# Altium integrated library myCPU Components.IntLib: 48 symbols
Pins are listed as number, name and electrical type; pins without a type are passive.

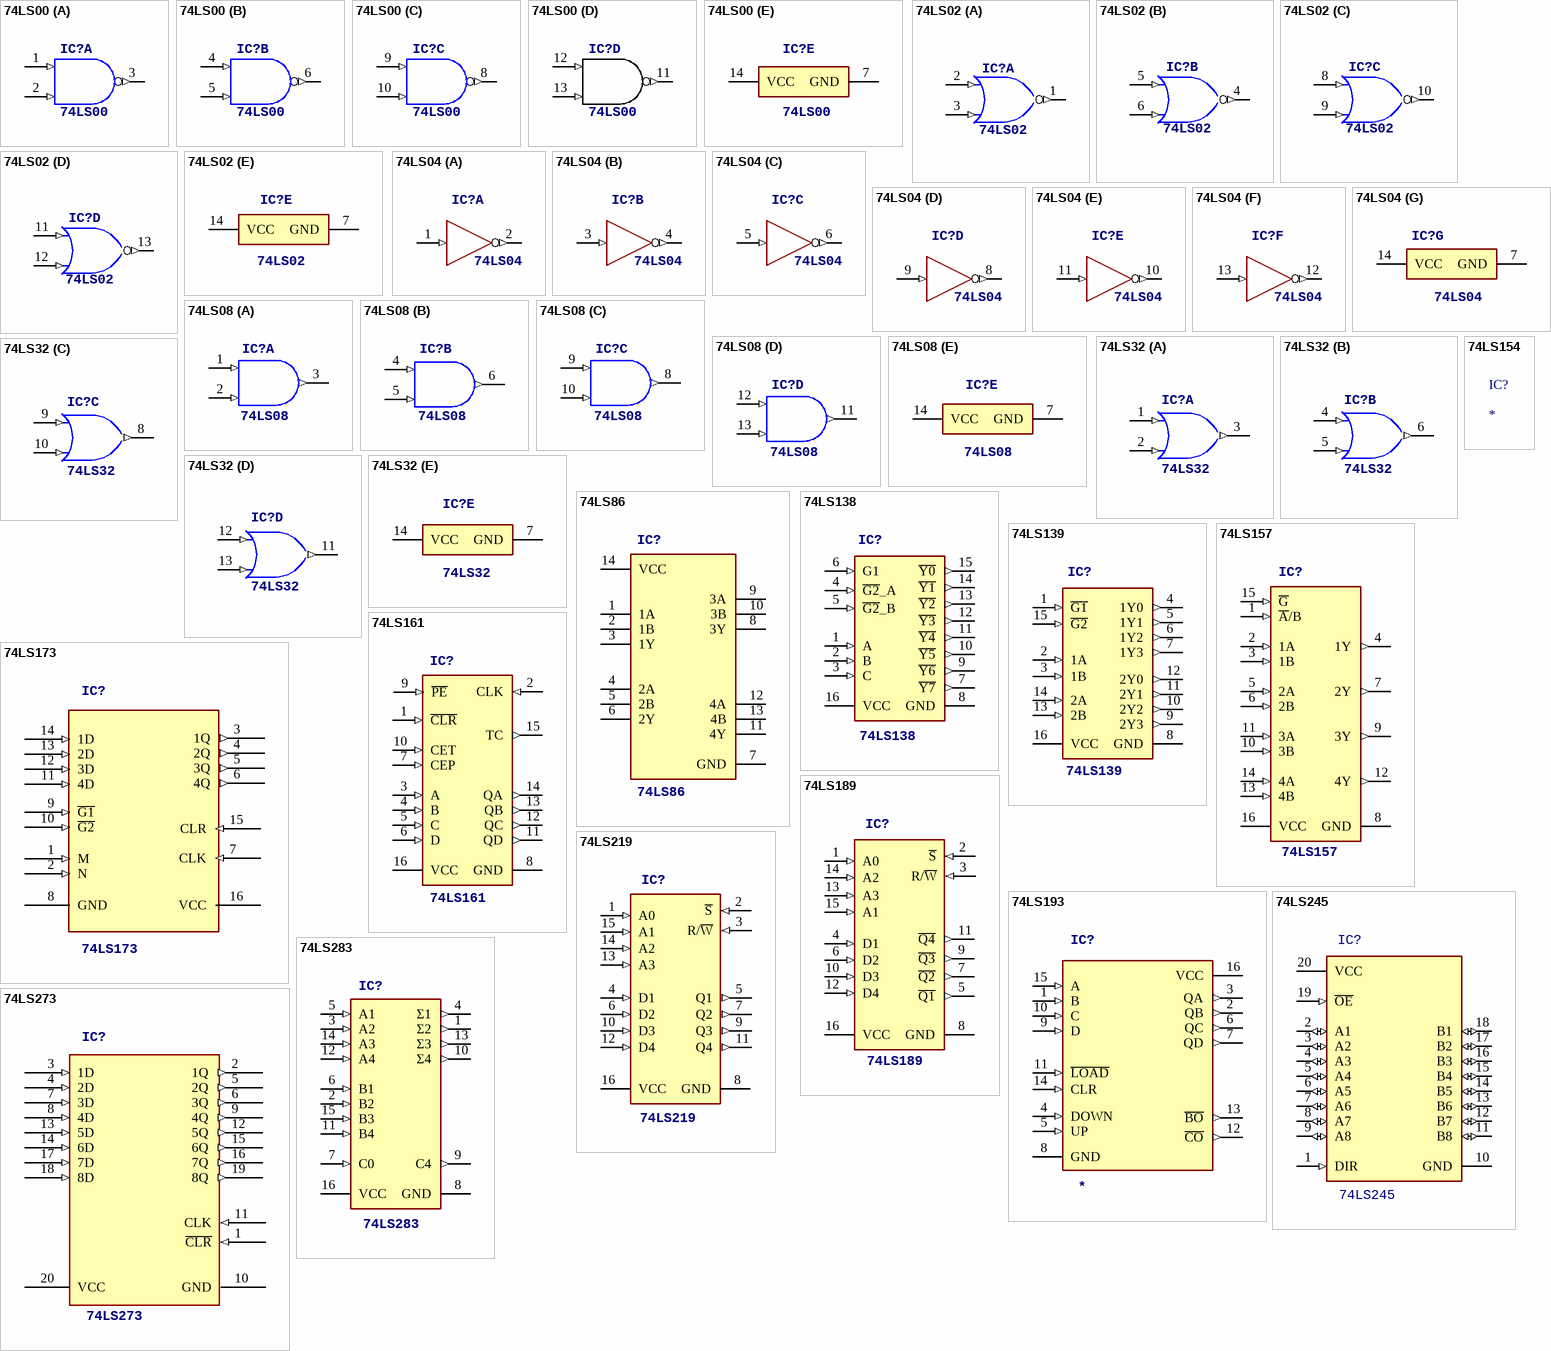
[diagram p0: symbols 74LS00 to 74LS283]

## 74LS00
designator IC?
Quad 2-input NAND gates; Value: 74LS00
footprint Generic_DIP14
part A pins: 1 1A (in) "Gate 1 input", 2 1B (in) "Gate 1 input", 3 1Y (out) "Gate 1 output"
part B pins: 4 2A (in) "Gate 2 input", 5 2B (in) "Gate 2 input", 6 2Y (out) "Gate 2 output"
part C pins: 8 3Y (out) "Gate 3 output", 9 3A (in) "Gate 3 input", 10 3B (in) "Gate 3 input"
part D pins: 11 4Y (out) "Gate 4 output", 12 4A (in) "Gate 4 input", 13 4B (in) "Gate 4 input"
part E pins: 7 GND (power) "Ground Pin", 14 VCC (power) "Power Pin"

## 74LS02
designator IC?
Quad 2-input NOR gates; Value: 74LS02
footprint Generic_DIP14
part A pins: 1 1Y (out) "1Y output", 2 1A (in) "1A input", 3 1B (in) "1B input"
part B pins: 4 2Y (out) "2Y output", 5 2A (in) "2A input", 6 2B (in) "2B input"
part C pins: 8 3A (in) "3A input", 9 3B (in) "3B input", 10 3Y (out) "3Y output"
part D pins: 11 4A (in) "4A input", 12 4B (in) "4B input", 13 4Y (out) "4Y output"
part E pins: 7 GND (power), 14 VCC (power)

## 74LS04
designator IC?
Hex inverters; Value: 74LS04
footprint Generic_DIP14
part A pins: 1 1A (in) "Input 1A", 2 ~{1Y} (out) "Output 1Y"
part B pins: 3 2A (in) "Input 2A", 4 ~{2Y} (out) "Output 2Y"
part C pins: 5 3A (in) "Input 3A", 6 ~{3Y} (out) "Output 3Y"
part D pins: 8 ~{4Y} (out) "Output 4Y", 9 4A (in) "Input 4A"
part E pins: 10 ~{5Y} (out) "Output 5Y", 11 5A (in) "Input 5A"
part F pins: 12 ~{6Y} (out) "Output 6Y", 13 6A (in) "Input 6A"
part G pins: 7 GND (power) "Ground Pin", 14 VCC (power) "Power Pin"

## 74LS08
designator IC?
Quad 2-input AND gates; Value: 74LS08
footprint Generic_DIP14
part A pins: 1 1A (in), 2 1B (in), 3 1Y (out)
part B pins: 4 2A (in), 5 2B (in), 6 2Y (out)
part C pins: 8 3Y (out), 9 3A (in), 10 3B (in)
part D pins: 11 4Y (out), 12 4A (in), 13 4B (in)
part E pins: 7 GND (power), 14 VCC (power)

## 74LS32
designator IC?
Quad 2-input OR gates.; Value: 74LS32
footprint Generic_DIP14
part A pins: 1 1A (in), 2 1B (in), 3 1Y (out)
part B pins: 4 2A (in), 5 2B (in), 6 2Y (out)
part C pins: 8 3Y (out), 9 3A (in), 10 3B (in)
part D pins: 11 4Y (out), 12 4A (in), 13 4B (in)
part E pins: 7 GND (power), 14 VCC (power)

## 74LS86
designator IC?
Quad 2-input XOR gates; Value: 74LS86
footprint Generic_DIP14
pins: 1 1A, 2 1B, 3 1Y, 4 2A, 5 2B, 6 2Y, 7 GND, 8 3Y, 9 3A, 10 3B, 11 4Y, 12 4A, 13 4B, 14 VCC

## 74LS138
designator IC?
3-Line to 8-Line decoder/demultiplexer; Value: 74LS138
footprint Generic_DIP16
pins: 1 A (in), 2 B (in), 3 C (in), 4 ~{G2}_A (in), 5 ~{G2}_B (in), 6 G1 (in), 7 ~{Y7} (out), 8 GND (power), 9 ~{Y6} (out), 10 ~{Y5} (out), 11 ~{Y4} (out), 12 ~{Y3} (out), 13 ~{Y2} (out), 14 ~{Y1} (out), 15 ~{Y0} (out), 16 VCC (power)

## 74LS139
designator IC?
Dual 2-to-4 Decoder/Demultiplexer; Value: 74LS139
footprint Generic_DIP16
pins: 1 ~{G1} (in), 2 1A (in), 3 1B (in), 4 1Y0 (out), 5 1Y1 (out), 6 1Y2 (out), 7 1Y3 (out), 8 GND (power), 9 2Y3 (out), 10 2Y2 (out), 11 2Y1 (out), 12 2Y0 (out), 13 2B (in), 14 2A (in), 15 ~{G2} (in), 16 VCC (power)

## 74LS154
designator IC?
Value: 74LS154

## 74LS157
designator IC?
4-Bits 2-Line to 1 Line data selector; Value: 74LS157
footprint Generic_DIP16 (DIP, 16-Leads, Body 19.7x6.6mm, Pitch 2.54mm)
pins: 1 ~{A}/B (in), 2 1A (in), 3 1B (in), 4 1Y (out), 5 2A (in), 6 2B (in), 7 2Y (out), 8 GND (power), 9 3Y (out), 10 3B (in), 11 3A (in), 12 4Y (out), 13 4B (in), 14 4A (in), 15 ~{G} (in), 16 VCC (power)

## 74LS161
designator IC?
4-Bit sync counter; Value: 74LS161
footprint Generic_DIP16 (DIP, 16-Leads, Body 19.7x6.6mm, Pitch 2.54mm)
pins: 1 ~{CLR} (in), 2 CLK (in), 3 A (in), 4 B (in), 5 C (in), 6 D (in), 7 CEP (in), 8 GND (power), 9 ~{PE} (in), 10 CET (in), 11 QD (out), 12 QC (out), 13 QB (out), 14 QA (out), 15 TC (out), 16 VCC (power)

## 74LS173
designator IC?
4-bit D-Type Register with 3 state outputs; Value: 74LS173
footprint Generic_DIP16 (DIP, 16-Leads, Body 19.7x6.6mm, Pitch 2.54mm)
pins: 1 M (in), 2 N (in), 3 1Q (out), 4 2Q (out), 5 3Q (out), 6 4Q (out), 7 CLK (in), 8 GND (power), 9 ~{G1} (in), 10 ~{G2} (in), 11 4D (in), 12 3D (in), 13 2D (in), 14 1D (in), 15 CLR (in), 16 VCC (power)

## 74LS189
designator IC?
SRAM 16x1 inverted outputs; Value: 74LS189
footprint Generic_DIP16 (DIP, 16-Leads, Body 19.7x6.6mm, Pitch 2.54mm)
pins: 1 A0 (in), 2 ~{S} (in), 3 R/~{W} (in), 4 D1 (in), 5 ~{Q1} (out), 6 D2 (in), 7 ~{Q2} (out), 8 GND (power), 9 ~{Q3} (out), 10 D3 (in), 11 ~{Q4} (out), 12 D4 (in), 13 A3 (in), 14 A2 (in), 15 A1 (in), 16 VCC (power)

## 74LS193
designator IC?
Value: 74LS193
footprint Generic_DIP16
pins: 1 B (in), 2 QB (out), 3 QA (out), 4 DOWN (in), 5 UP (in), 6 QC (out), 7 QD (out), 8 GND (power), 9 D (in), 10 C (in), 11 ~{LOAD} (in), 12 ~{CO} (out), 13 ~{BO} (out), 14 CLR (in), 15 A (in), 16 VCC (power)

## 74LS219
designator IC?
SRAM 16x1 non inverted outputs; Value: 74LS219
footprint Generic_DIP16 (DIP, 16-Leads, Body 19.7x6.6mm, Pitch 2.54mm)
pins: 1 A0 (in), 2 ~{S} (in), 3 R/~{W} (in), 4 D1 (in), 5 Q1 (out), 6 D2 (in), 7 Q2 (out), 8 GND (power), 9 Q3 (out), 10 D3 (in), 11 Q4 (out), 12 D4 (in), 13 A3 (in), 14 A2 (in), 15 A1 (in), 16 VCC (power)

## 74LS245
designator IC?
Non inverting bus transceiver; Value: 74LS245
footprint Generic_DIP20
pins: 1 DIR (in), 2 A1 (io), 3 A2 (io), 4 A3 (io), 5 A4 (io), 6 A5 (io), 7 A6 (io), 8 A7 (io), 9 A8 (io), 10 GND (power), 11 B8 (io), 12 B7 (io), 13 B6 (io), 14 B5 (io), 15 B4 (io), 16 B3 (io), 17 B2 (io), 18 B1 (io), 19 ~{OE} (in), 20 VCC (power)

## 74LS273
designator IC?
8-bit D-Type Register with 3 state outputs; Value: 74LS273
footprint Generic_DIP20
pins: 1 ~{CLR} (in), 2 1Q (out), 3 1D (in), 4 2D (in), 5 2Q (out), 6 3Q (out), 7 3D (in), 8 4D (in), 9 4Q (out), 10 GND (power), 11 CLK (in), 12 5Q (out), 13 5D (in), 14 6D (in), 15 6Q (out), 16 7Q (out), 17 7D (in), 18 8D (in), 19 8Q (out), 20 VCC (power)

## 74LS283
designator IC?
4-Bits Full adder with fast carry; Value: 74LS283
footprint Generic_DIP16 (DIP, 16-Leads, Body 19.7x6.6mm, Pitch 2.54mm)
pins: 1 Σ2 (out), 2 B2 (in), 3 A2 (in), 4 Σ1 (out), 5 A1 (in), 6 B1 (in), 7 C0 (in), 8 GND (power), 9 C4 (out), 10 Σ4 (out), 11 B4 (in), 12 A4 (in), 13 Σ3 (out), 14 A3 (in), 15 B3 (in), 16 VCC (power)

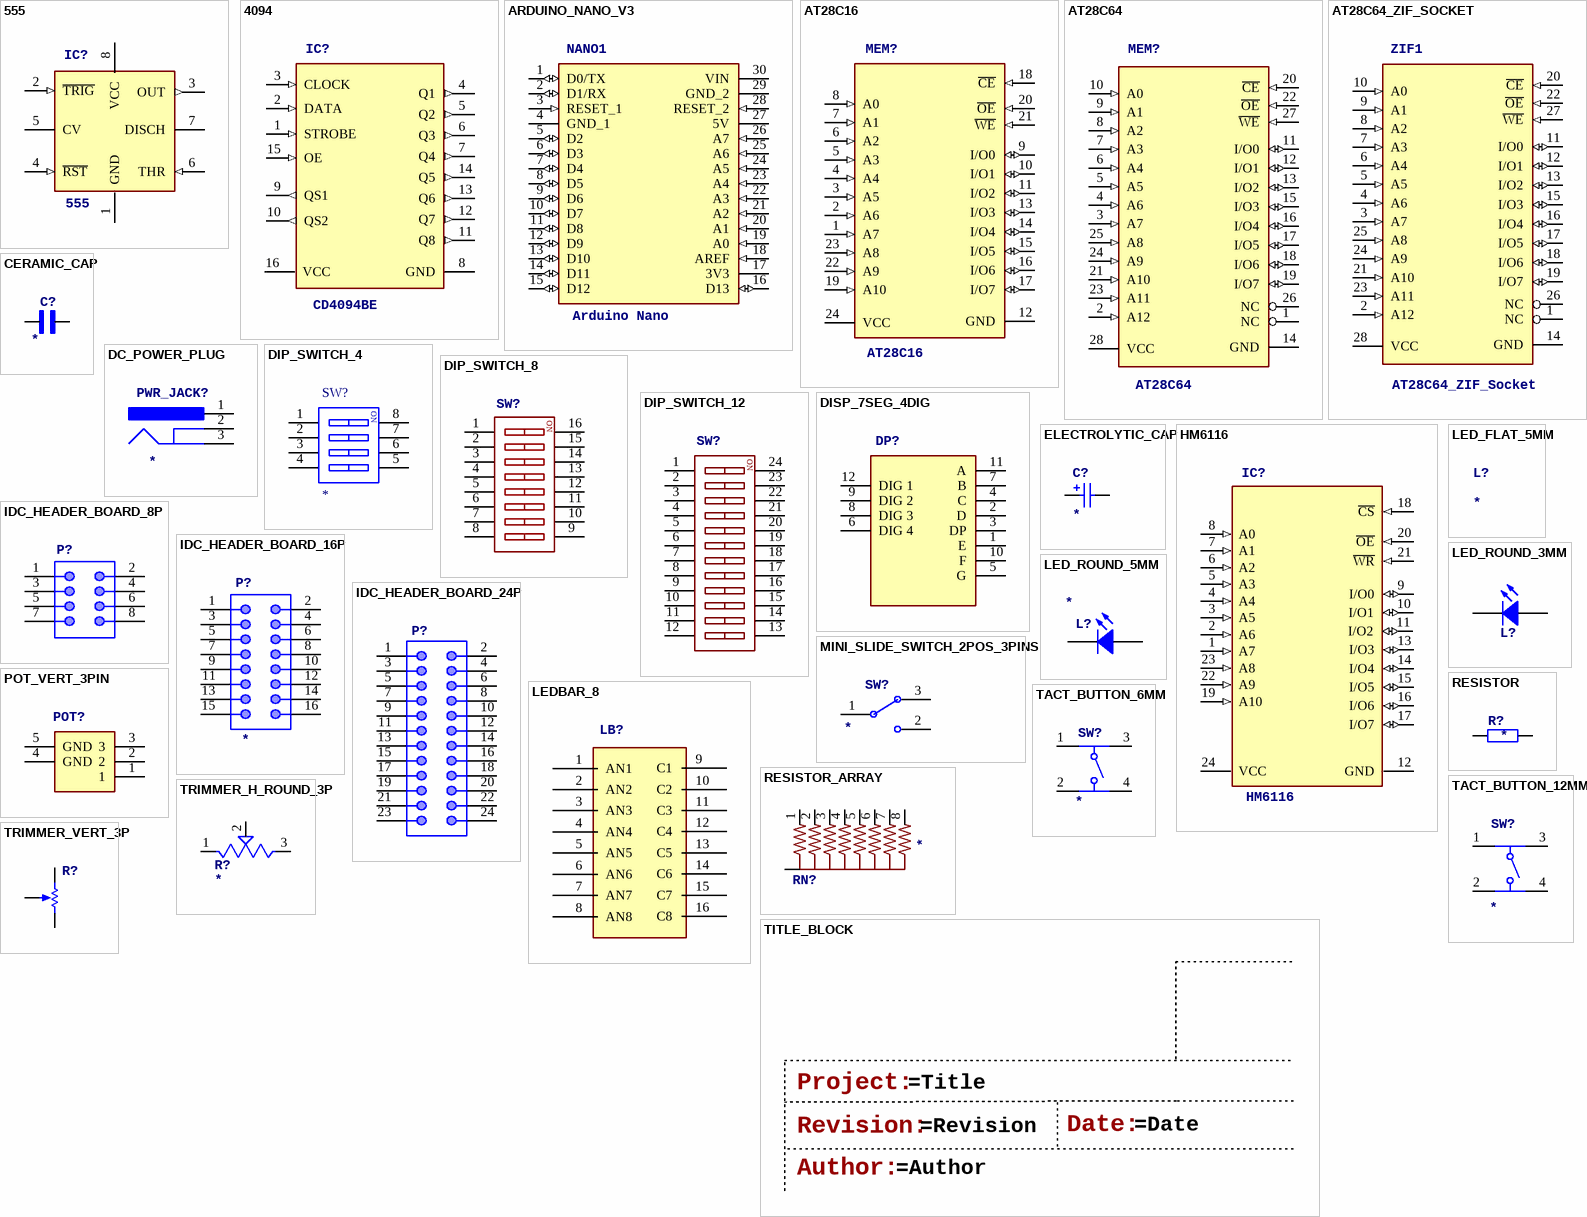
[diagram p1: symbols 555 to TRIMMER_VERT_3P]

## 555
designator IC?
555 Timer; Value: 555
footprint GENERIC_DIP8
pins: 1 GND (power), 2 ~{TRIG} (in), 3 OUT (out), 4 ~{RST} (in), 5 CV, 6 THR (in), 7 DISCH (oc), 8 VCC (power)

## 4094
designator IC?, comment CD4094BE
CMOS 8 bits shift register,3 state; Value: CD4094BE
footprint Generic_DIP16
pins: 1 STROBE (in), 2 DATA (in), 3 CLOCK (in), 4 Q1 (out), 5 Q2 (out), 6 Q3 (out), 7 Q4 (out), 8 GND (power), 9 QS1 (out), 10 QS2 (out), 11 Q8 (out), 12 Q7 (out), 13 Q6 (out), 14 Q5 (out), 15 OE (in), 16 VCC (power)

## ARDUINO_NANO_V3
designator NANO1, comment Arduino Nano
Arduino NANO v3; Value: ARDUINO_NANO_V3
footprint ARDUINO_NANO_V3
pins: 1 D0/TX (io), 2 D1/RX (io), 3 RESET_1 (in), 4 GND_1 (power), 5 D2 (io), 6 D3 (io), 7 D4 (io), 8 D5 (io), 9 D6 (io), 10 D7 (io), 11 D8 (io), 12 D9 (io), 13 D10 (io), 14 D11 (io), 15 D12 (io), 16 D13 (io), 17 3V3 (power), 18 AREF (in), 19 A0 (in), 20 A1 (in), 21 A2 (in), 22 A3 (in), 23 A4 (in), 24 A5 (in), 25 A6 (in), 26 A7 (in), 27 5V (power), 28 RESET_2 (in), 29 GND_2 (power), 30 VIN (power)

## AT28C16
designator MEM?
EEProm 16K, 2K x 8 bits; Value: AT28C16
footprint GENERIC_DIP24_W
pins: 1 A7 (in), 2 A6 (in), 3 A5 (in), 4 A4 (in), 5 A3 (in), 6 A2 (in), 7 A1 (in), 8 A0 (in), 9 I/O0 (io), 10 I/O1 (io), 11 I/O2 (io), 12 GND (power), 13 I/O3 (io), 14 I/O4 (io), 15 I/O5 (io), 16 I/O6 (io), 17 I/O7 (io), 18 ~{CE} (in), 19 A10 (in), 20 ~{OE} (in), 21 ~{WE} (in), 22 A9 (in), 23 A8 (in), 24 VCC (power)

## AT28C64
designator MEM?
EEProm 64K, 8K x 8 bits; Value: AT28C64
footprint GENERIC_DIP28_W
pins: 1 NC, 2 A12 (in), 3 A7 (in), 4 A6 (in), 5 A5 (in), 6 A4 (in), 7 A3 (in), 8 A2 (in), 9 A1 (in), 10 A0 (in), 11 I/O0 (io), 12 I/O1 (io), 13 I/O2 (io), 14 GND (power), 15 I/O3 (io), 16 I/O4 (io), 17 I/O5 (io), 18 I/O6 (io), 19 I/O7 (io), 20 ~{CE} (in), 21 A10 (in), 22 ~{OE} (in), 23 A11 (in), 24 A9 (in), 25 A8 (in), 26 NC, 27 ~{WE} (in), 28 VCC (power)

## AT28C64_ZIF_SOCKET
designator ZIF1, comment AT28C64_ZIF_Socket
AT28C64 ZIF Socket; Value: ZIF socket 28W
footprint ZIF_SOCKET_28W
pins: 1 NC, 2 A12 (in), 3 A7 (in), 4 A6 (in), 5 A5 (in), 6 A4 (in), 7 A3 (in), 8 A2 (in), 9 A1 (in), 10 A0 (in), 11 I/O0 (io), 12 I/O1 (io), 13 I/O2 (io), 14 GND (power), 15 I/O3 (io), 16 I/O4 (io), 17 I/O5 (io), 18 I/O6 (io), 19 I/O7 (io), 20 ~{CE} (in), 21 A10 (in), 22 ~{OE} (in), 23 A11 (in), 24 A9 (in), 25 A8 (in), 26 NC, 27 ~{WE} (in), 28 VCC (power)

## CERAMIC_CAP
designator C?
Ceramic capacitor; Value: *
footprint CAP_CERAMIC
pins: 1, 2

## DC_POWER_PLUG
designator PWR_JACK?
DC Power Jack, 2.5 A, 2 mm Center Pin, 3 Position, THT Right Angle; Value: *
footprint DC_POWER_JACK_2MM_ANGLED
pins: 1, 2, 3

## DIP_SWITCH_4
designator SW?
DIP switch 4 positions; Value: *
footprint DIP_SWITCH_4
pins: 1, 2, 3, 4, 5, 6, 7, 8
text: ON

## DIP_SWITCH_8
designator SW?  (value not drawn)
DIP switch 8 positions; Value: DIP switch 8 positions
footprint DIP_SWITCH_8
pins: 1, 2, 3, 4, 5, 6, 7, 8, 9, 10, 11, 12, 13, 14, 15, 16
text: ON

## DIP_SWITCH_12
designator SW?  (value not drawn)
DIP switch 12 positions; Value: DIP switch 12 positions
footprint DIP_SWITCH_12
pins: 1, 2, 3, 4, 5, 6, 7, 8, 9, 10, 11, 12, 13, 14, 15, 16, 17, 18, 19, 20, 21, 22, 23, 24
text: ON

## DISP_7SEG_4DIG
designator DP?  (value not drawn)
Display 7 segments 4 digits 0.36"; Value: Display 7 segments 4 digits 0.36"
footprint DISP_7S_4D_56
pins: 1 E, 2 D, 3 DP, 4 C, 5 G, 6 DIG 4, 7 B, 8 DIG 3, 9 DIG 2, 10 F, 11 A, 12 DIG 1

## ELECTROLYTIC_CAP
designator C?
Electrolytic capacitor 16v/50v; Value: *
footprint CAP_ELECTROLYTIC_RADIAL
pins: 1 P, 2 N

## HM6116
designator IC?
SRAM 64K x 1bit, 8K x 8 Bits; Value: HM6116
footprint GENERIC_DIP24_W
pins: 1 A7 (in), 2 A6 (in), 3 A5 (in), 4 A4 (in), 5 A3 (in), 6 A2 (in), 7 A1 (in), 8 A0 (in), 9 I/O0 (io), 10 I/O1 (io), 11 I/O2 (io), 12 GND (power), 13 I/O3 (io), 14 I/O4 (io), 15 I/O5 (io), 16 I/O6 (io), 17 I/O7 (io), 18 ~{CS} (in), 19 A10 (in), 20 ~{OE} (in), 21 ~{WR} (in), 22 A9 (in), 23 A8 (in), 24 VCC (power)

## IDC_HEADER_BOARD_8P
designator P?  (value not drawn)
IDC socket male 8 pins,2x4 odd-even; Value: IDC socket male 8 pins,2x4 odd-even
footprint IDC_HEADER_BOARD_8P
pins: 1, 2, 3, 4, 5, 6, 7, 8

## IDC_HEADER_BOARD_16P
designator P?
IDC socket male 16 pins, 2x8 odd-even; Value: IDC socket male 16 pins, 2x8 odd-even
footprint IDC_HEADER_BOARD_16P
pins: 1, 2, 3, 4, 5, 6, 7, 8, 9, 10, 11, 12, 13, 14, 15, 16

## IDC_HEADER_BOARD_24P
designator P?, comment IDC HEAD 24P  (value not drawn)
IDC socket male 24 pins,2x12 odd-even; Value: IDC socket male 24 pins,2x12 odd-even
footprint IDC_HEADER_BOARD_24P
pins: 1, 2, 3, 4, 5, 6, 7, 8, 9, 10, 11, 12, 13, 14, 15, 16, 17, 18, 19, 20, 21, 22, 23, 24

## LED_FLAT_5MM
designator L?
Led Flat 5mm; Value: Led Flat 5mm

## LED_ROUND_3MM
designator L?  (value not drawn)
Led 3mm Round; Value: Led 3mm Round
footprint LED_ROUND_3MM
pins: 1 K, 2 A

## LED_ROUND_5MM
designator L?
Led 5mm Round; Value: Led 5mm Round
footprint LED_ROUND_5MM
pins: 1 K, 2 A

## LEDBAR_8
designator LB?  (value not drawn)
Led Indicator Bar 8 segments, DIP 16; Value: Led Indicator Bar 8 segments, DIP 16
footprint LED_Bar_8
pins: 1 AN1, 2 AN2, 3 AN3, 4 AN4, 5 AN5, 6 AN6, 7 AN7, 8 AN8, 9 C1, 10 C2, 11 C3, 12 C4, 13 C5, 14 C6, 15 C7, 16 C8

## MINI_SLIDE_SWITCH_2POS_3PINS
designator SW?
Mini slide switch 2 pos, 3 pins; Value: Mini slide switch 2 pos, 3 pins
footprint MINI_SLIDE_SWITCH_3PINS
pins: 1 COM, 2, 3

## POT_VERT_3PIN
designator POT?  (value not drawn)
Potentiometer vertical, rotary, 3pins; Value: Potentiometer vertical, rotary, 3pins
footprint POT_VERT_3PIN
pins: 1, 2, 3, 4 GND, 5 GND

## RESISTOR
designator R?
Resistor axial; Value: *
footprint RESISTOR
pins: 1, 2

## RESISTOR_ARRAY
designator RN?
Resistor array 8 elements,9 pins; Value: *
footprint RESISTOR_ARRAY
pins: 1, 2, 3, 4, 5, 6, 7, 8, C

## TACT_BUTTON_6MM
designator SW?
Tactile button 6 mm; Value: *
footprint TACT_BUTTON_6MM
pins: 1, 2, 3, 4

## TACT_BUTTON_12MM
designator SW?
Tactile button 12 mm; Value: *
footprint TACT_BUTTON_12MM
pins: 1, 2, 3, 4

## TITLE_BLOCK
designator *  (value not drawn)
text: Project:; Revision:; Date:; Author:

## TRIMMER_H_ROUND_3P
designator R?
Vertical variable resistor 3 pins; Value: *
footprint TRIMMER_H_ROUND_3P
pins: 1 CCW, 2 W, 3 CW

## TRIMMER_VERT_3P
designator R?, comment Trimmer 3pin  (value not drawn)
Trimmer resistor 3 pin; Value: *
footprint TRIMMER_RESISTOR_3PIN
pins: 1 CCW, 2 S, 3 CW